# Altium integrated library CoLib.IntLib: 649 symbols (part 3 of 5) (continued)
## MPC8270CZUUPEA
designator U?
PQ2:450MHz主频100MHz总线; Manufacturer: Freescale; Name: 微处理器; 物料型号说明: 主频450MHz总线100MHz; Price: 350; 物料替代型号: n/a; Ordering NO.: MPC8270CZUUPEA
footprint TBGA480/1.27_29*29 (TBGA,480 Leads,Pitch=50mil (1.27mm),29行，29列)
part A pins: AB5 PA31/FCC1_MII_COL, AB26 PC0/DREQ1#/SMSYN2#/L1CLK0A2, AC4 PB31/FCC2_MII_TX_ER, AC5 PB30/FCC2_MII_RX_DV, AC25 PA1/REJECT1#/DONE3#, AC28 PD4/FCC3_RTS#/SMRXD2, AC29 PA0/RESTART1#/DREQ3, AD1 PC31/CLK1, AD2 PD31/RXD1, AD3 PA30/FCC1_MII_CRS, AD4 PD30/TXD1, AD5 PA28/FCC1_MII_TX_EN, AD25 PB6/FCC3_TXD1/L1RXDA2, AD26 PB5/FCC3_TXD2/L1TSYNCA2, AD27 PD5/DONE1#, AD28 PB4/FCC3_TXD3/L1RSYNCA2, AD29 PC1/DREQ2/L1RQA2#, AE1 PC30/CLK2, AE2 PB29/FCC2_MII_TX_EN, AE3 PB28/FCC2_MII_RX_ER, AE4 PD28/RXD2, AE8 PC25/CLK7, AE9 PB25/FCC2_TXD3, AE10 PC23/CLK9, AE12 PD23/RTS3#/TENA3#, AE13 PA21/FCC1_TXD3, AE14 PB18/FCC2_RXD3, AE15 PB23/FCC2_TXD1, AE16 PA17/FCC1_RXD0, AE18 PC12/CD2#/RENA2, AE19 PC11/CTS3#/CLSN3, AE20 PD14/L1CLKOC2/I2CSCL, AE21 PC9/CTS4#/CLSN4, AE22 PA10/MSNUM5, AE24 PA6, AE26 PB7/FCC3_TXD0/L1TXDA2, AE27 PC3/DACK2#/CTS4#, AE28 PA2/CLK20/DACK3#, AE29 PC2/DONE2#, AF1 PA29/FCC1_MII_TX_ER, AF2 PC29/CLK3/CTS1#/CLSN1, AF3 PC28/CLK4/CTS2#/CLSN2, AF7 PA27/FCC1_MII_RX_DV, AF9 PC24/CLK8, AF10 PD24/TXD3, AF12 PA22, AF13 PB19/FCC2_RXD2, AF15 PC16/CLK16, AF16 PD18/SPICLK, AF17 PA16/FCC1_RXD1, AF18 PA15/FCC1_RXD2, AF19 PB15/FCC3_MII_TX_ER, AF20 PC10/CD3#/RENA3, AF22 PC8/CD4#/RENA4, AF23 PA8/SMRXD2, AF24 PC5/SI2_L1ST3, AF27 PC4/SI2_L1ST4, AF28 PD7/SMSYN1/FCC1_CLAV2, AF29 PD6/DACK1#, AG1 PD29/RTS1#/TENA1, AG2 PC27/FCC3_TXD0/CLK5, AG7 PD27/TXD2, AG9 PD25/RXD3, AG10 PC22/CLK10, AG11 PA23, AG12 PB20/FCC2_RXD1, AG13 PC19/CLK13, AG15 PA19/FCC1_TXD1, AG16 PC15/CTS1#/CLSN1, AG17 PD17/SPIMOSI, AG18 PD16/SPIMISO, AG19 PA14/FCC1_RXD3, AG20 PB14/FCC3_MII_TX_EN, AG22 PB12/FCC3_MII_CRS, AG23 PD12, AG24 PB9/FCC3_RXD1/L1TXD2A2, AG25 PD8/SMRXD1, AG26 PA5/RESTART2#/DREQ4, AG28 PA4/REFECT2#/DONE4#, AG29 PA3/CLK19/DACK4#/L1RXD1A2, AH6 PB27/FCC2_MII_COL, AH7 PA26/FCC1_MII_RX_ER, AH8 PD26/RTS2#/TENA2, AH9 PA24/MSNUM1, AH11 PB21/FCC2_RXD0, AH12 PC20/CLK12, AH13 PD21/TXD4, AH14 PC18/CLK14, AH15 PD19/SPISEL, AH16 PB22/FCC2_TXD0, AH17 PC14/CD1#/RENA1, AH18 PC13/CTS2#/CLSN2, AH20 PA13/MSNUM2, AH21 PB13/FCC3_MII_COL, AH22 PA11/MSNUM4, AH23 PA9/SMTXD2, AH24 PB10/FCC3_RXD2, AH25 PA7/SMSYN2, AH26 PD9/SMTXD1, AH27 PB8/FCC3_RXD0, AJ6 PC26/CLK6, AJ7 PB26/FCC2_MII_CRS, AJ8 PA25/MSNUM0, AJ9 PB24/FCC2_TXD2, AJ11 PC21/CLK11, AJ12 PD22/RXD4, AJ13 PA20/FCC1_TXD2, AJ14 PD20/RTS4#/TENA4, AJ15 PC17/CLK15, AJ16 PA18/FCC1_TXD0, AJ17 PB17/FCC3_MII_RX_DV, AJ18 PB16/FCC3_MII_RX_ER, AJ20 PD15/L1RQC2#/I2CSDA, AJ21 PA12/MSNUM3, AJ22 PD13, AJ23 PD11/L1RQB2#, AJ24 PB11/FCC3_RXD3, AJ25 PC7/FCC1_CTS#, AJ26 PC6/FCC1_CD#, AJ27 PD10/L1CLKOB2/BRGO4
part B pins: AA1 THERMAL0, AA25 L-A27/GNT2#, AA26 L-A25/GNT0#, AA27 L-A23/REQ0#, AA28 L_D31/AD31 (io), AA29 L_D30/AD30 (io), AB27 L-A31/DLLOUT, AB28 L-A29/INTA#, AB29 L-A28/RST#, AE11 CLKIN2, AF25 PCI-MODE#, AG4 THERMAL1, B27 LSDAMUX/PCI-MODCK, C26 LGTA#/LUPMWAIT/LGPL4/LPBS#, C28 LSDWE#/PCI_MODCKH1, D25 LSDCAS#/PCI_MODCKH3, D27 LSDA10/PCI_MODCKH0, D28 LWR#, E26 LSDRAS#/PCI_MODCKH2, G29 LWE3#/LSDDQM3#/PCI_CFG3, H26 LWE2#/LSDDQM2#/PCI_CFG2, H27 LWE1#/LSDDQM1#/PCI_CFG1, H28 LWE0#/LSDDQM0#/PCI_CFG0, H29 L_D0/AD0 (io), J25 L_D5/AD5 (io), J26 L_D4/AD4 (io), J27 L_D3/AD3 (io), J28 L_D2/AD2 (io), J29 L_D1/AD1 (io), K25 L_D6/AD6 (io), L25 L_D10/AD10 (io), L26 L_D9/AD9 (io), L27 L_D8/AD8 (io), L28 L_DP0/BE0# (io), L29 L_D7/AD7 (io), M26 L_D14/AD14 (io), M27 L_D13/AD13 (io), M28 L_D12/AD12 (io), M29 L_D11/AD11 (io), N25 L-A26/GNT1#, N26 L-A22/SERR#, N27 L_A14/PAR, N28 L_DP1/BE1# (io), N29 L_D15/AD15 (io), P25 L-A30/REQ2#, P28 L-A21/PERR#, P29 L-A24/REQ1#, R26 L-A17/IRDY#/CKSTP-OUT#, R27 L-A16/TRDY#, R28 L-A19/DEVSEL#, R29 L-A18/STOP#, T25 L_D16/AD16 (io), T28 L_DP2/BE2# (io), T29 L-A15/FRAME#/SMI#, U5 SPARE4, U25 L_D19/AD19 (io), U26 L_D18/AD18 (io), U27 L_D17/AD17 (io), V4 SPARE6, V26 L_D23/AD23 (io), V27 L_D22/AD22 (io), V28 L_D21/AD21 (io), V29 L_D20/AD20 (io), W25 L_D26/AD26 (io), W26 L_D25/AD25 (io), W27 L_D24/AD24 (io), W28 L_DP3/BE3# (io), W29 L-A20/IDSEL, Y25 L_D29/AD29 (io), Y28 L_D28/AD28 (io), Y29 L_D27/AD27 (io)
part C pins: A1 VCC_3.3V (power), A2 VCC_3.3V (power), A9 VCC_1.5V (power), A19 VCC_1.5V (power), A28 VCC_3.3V (power), A29 VCC_3.3V (power), AA2 GND (power), AA4 VCC_3.3V (power), AA5 GND (power), AB1 GNDSYN, AB2 XFC, AB3 VCCSYN, AB25 GND (power), AC1 VCC_1.5V (power), AC2 VCC_1.5V (power), AC3 GND (power), AC26 GND (power), AC27 VCC_3.3V (power), AE5 VCC_3.3V (power), AE7 GND (power), AE17 GND (power), AE23 GND (power), AE25 VCC_3.3V (power), AF4 VCC_3.3V (power), AF8 GND (power), AF11 GND (power), AF14 GND (power), AF21 GND (power), AF26 VCC_3.3V (power), AG3 VCC_3.3V (power), AG8 VCC_3.3V (power), AG14 VCC_3.3V (power), AG21 VCC_3.3V (power), AG27 VCC_3.3V (power), AH1 VCC_3.3V (power), AH2 VCC_3.3V (power), AH10 VCC_1.5V (power), AH19 VCC_1.5V (power), AH28 VCC_3.3V (power), AH29 VCC_3.3V (power), AJ1 VCC_3.3V (power), AJ2 VCC_3.3V (power), AJ5 VCC_1.5V (power), AJ10 VCC_1.5V (power), AJ19 VCC_1.5V (power), AJ28 VCC_3.3V (power), AJ29 VCC_3.3V (power), B1 VCC_3.3V (power), B2 VCC_3.3V (power), B3 GND (power), B9 VCCSYN1, B19 VCC_1.5V (power), B28 VCC_3.3V (power), B29 VCC_3.3V (power), C3 VCC_3.3V (power), C7 VCC_3.3V (power), C9 GND (power), C14 VCC_3.3V (power), C16 VCC_3.3V (power), C20 VCC_3.3V (power), C23 VCC_3.3V (power), C27 VCC_3.3V (power), D4 VCC_3.3V (power), D7 GND (power), D10 GND (power), D14 GND (power), D16 GND (power), D20 GND (power), D23 GND (power), D26 VCC_3.3V (power), E5 VCC_3.3V (power), E10 VCC_3.3V (power), E11 GND (power), E13 GND (power), E15 GND (power), E19 GND (power), E22 GND (power), E25 VCC_3.3V (power), G5 GND (power), G26 GND (power), G27 VCC_3.3V (power), H3 VCC_3.3V (power), H4 GND (power), H25 GND (power), K5 GND (power), K26 VCC_3.3V (power), K27 GND (power), K28 VCC_1.5V (power), K29 VCC_1.5V (power), M1 VCC_1.5V (power), M2 VCC_1.5V (power), M3 GND (power), M4 VCC_3.3V (power), M25 GND (power), P5 GND (power), P26 GND (power), P27 VCC_3.3V (power), R25 GND (power), T3 VCC_3.3V (power), T4 GND (power), T26 GND (power), T27 VCC_3.3V (power), U28 VCC_1.5V (power), U29 VCC_1.5V (power), V25 GND (power), Y1 VCC_1.5V (power), Y2 VCC_1.5V (power), Y5 GND (power), Y26 GND (power), Y27 VCC_3.3V (power)
part D pins: A3 D39, A4 D30, A5 D22, A6 D6, A7 D53, A8 D21, A10 D44, A11 D12, A12 D35, A13 D3, A14 D42, A15 D34, A16 D2, A17 D41, A18 D1, A20 D8, A21 IRQ6#/DP6/CSE0, A22 IRQ1#/DP1/EXT_BG2#, A23 PGTA#/PUPMWAIT/PGPL4/PPBS#, A24 POE#/PSDRAS#/PGPL2, A25 PWE7#/PSDDQM7#/PBS7#, A26 PWE5#/PSDDQM5#/PBS5#, A27 BCTL0#, AA3 QREQ#, AB4 TRIS#, AE6 TDI, AF5 TDO, AF6 SRESET#, AG5 TCK, AG6 PORESET#, AH3 TRST#, AH4 CLKIN1, AH5 HRESET#, AJ3 TMS, AJ4 RSTCONF#, B4 D15, B5 D7, B6 D46, B7 D14, B8 D29, B10 D52, B11 D20, B12 D43, B13 D11, B14 D50, B15 D10, B16 D57, B17 D33, B18 D56, B20 D0, B21 IRQ5#/DP5/TBEN#/EXT_DBG3#, B22 DP0/RSRV#/EXT_BR2#, B23 PSDCAS#/PGPL3, B24 PSDWE#/PGPL1, B25 PWE6#/PSDDQM6#/PBS6#, B26 PWE4#/PSDDQM4#/PBS4#, C1 TSIZ0, C2 D63, C4 D47, C5 D23, C6 D54, C8 D37, C10 D60, C11 D28, C12 D51, C13 D19, C15 D26, C17 D25, C18 D48, C19 D24, C21 IRQ4#/DP4/CORE_SRESET#/EXT_BG3#, C22 TA#, C24 PWE3#/PSDDQM3#/PBS3#, C25 PWE0#/PSDDQM0#/PBS0#, C29 CS1#, D1 IRQ7#/INT_OUT#/APE#, D2 TSIZ2, D3 TBST#, D5 D55, D6 D62, D8 D45, D9 D5, D11 D36, D12 D59, D13 D27, D15 D18, D17, D18 D40, D19 D16, D21 IRQ3#/DP3/CKSTP_OUT#/EXT_BR3#, D22 PSDAMUX/PGPL5, D24 PWE2#/PSDDQM2#/PBS2#, D29 CS8#, E1 ARTRY#, E2 ABB#/IRQ2#, E3 TS#, E4 TSIZ1, E6 D31, E7 D38, E8 D61, E9 D13, E12 D4, E14 D58, E16 D49, E17 D9, E18 D32, E20 IRQ7#/DP7/CSE1, E21 IRQ2#/DP2/TLBISYNC#/EXT_DBG2#, E23 PSDA10/PGPL0, E24 PWE1#/PSDDQM1#/PBS1#, E27 CS2#, E28 CS3#, E29 CS9#, F1 TT0, F2 TT4, F3 AACK#, F4 BG#, F5 TSIZ3, F25 CS0#, F26 CS4#, F27 CS5#, F28 CS6#, F29 CS10#/BCTL1#, G1 A0, G2 TT3, G3 TT2, G4 TT1, G25 CS7#, G28 CS11#/AP0, H1 A3, H2 A2, H5 A1, J1 A8, J2 A7, J3 A6, J4 A5, J5 A4, K1 A12, K2 A11, K3 A10, K4 A9, L1 A17, L2 A16, L3 A15, L4 A14, L5 A13, M5 A18, N1 A23, N2 A22, N3 A21, N4 A20, N5 A19, P1 A27, P2 A26, P3 A25, P4 A24, R1 A28, R2 CPU_DBG#, R3 A29, R4 A31, R5 A30, T1 IRQ0#/NMI_OUT#, T2 ALE, T5 BADDR27, U1 BADDR28, U2 CI#/BADDR29/IRQ2#, U3 WT#/BADDR30/IRQ3#, U4 CPU_BG#/ADDR31/IRQ5#, V1 DBG#, V2 DBB#/IRQ3#, V3 PSDVAL#, V5 TEA#, W1 GBL#/IRQ1#, W2 MODCK1/AP1/TC0/BNKSEL0, W3 MODCK2/AP2/TC1/BNKSEL1, W4 MODCK3/AP3/TC2/BNKSEL2, W5 BR#, Y3 CPU_BR#, Y4 L2_HIT#/IRQ4#

## STC15F104W/SOP8
designator U?, comment STC15F104
单片机STC; Manufacturer: STC; 物料参考价格: 1.01; 物料说明: STC单片机,51兼容; Ordering NO.: STC15F104W/SO8; 物料型号说明: SO8封装; Name: 单片机; 物料替代型号: n/a
footprint SO8/1.27_4.9*3.9 (SOIC, 8-Leads, Body 4.9x3.9mm, Pitch 1.27mm,)
pins: 1 P3.4/RST/T0/~{INT2}/MCLKO, 2 VCC (power), 3 P3.5/T0CLKO/~{INT3}, 4 GND (power), 5 T2CLKO/~{INT4}/P3.0, 6 T2/P3.1, 7 INT0/P3.2, 8 RSTOUT_LOW/INT1/P3.3


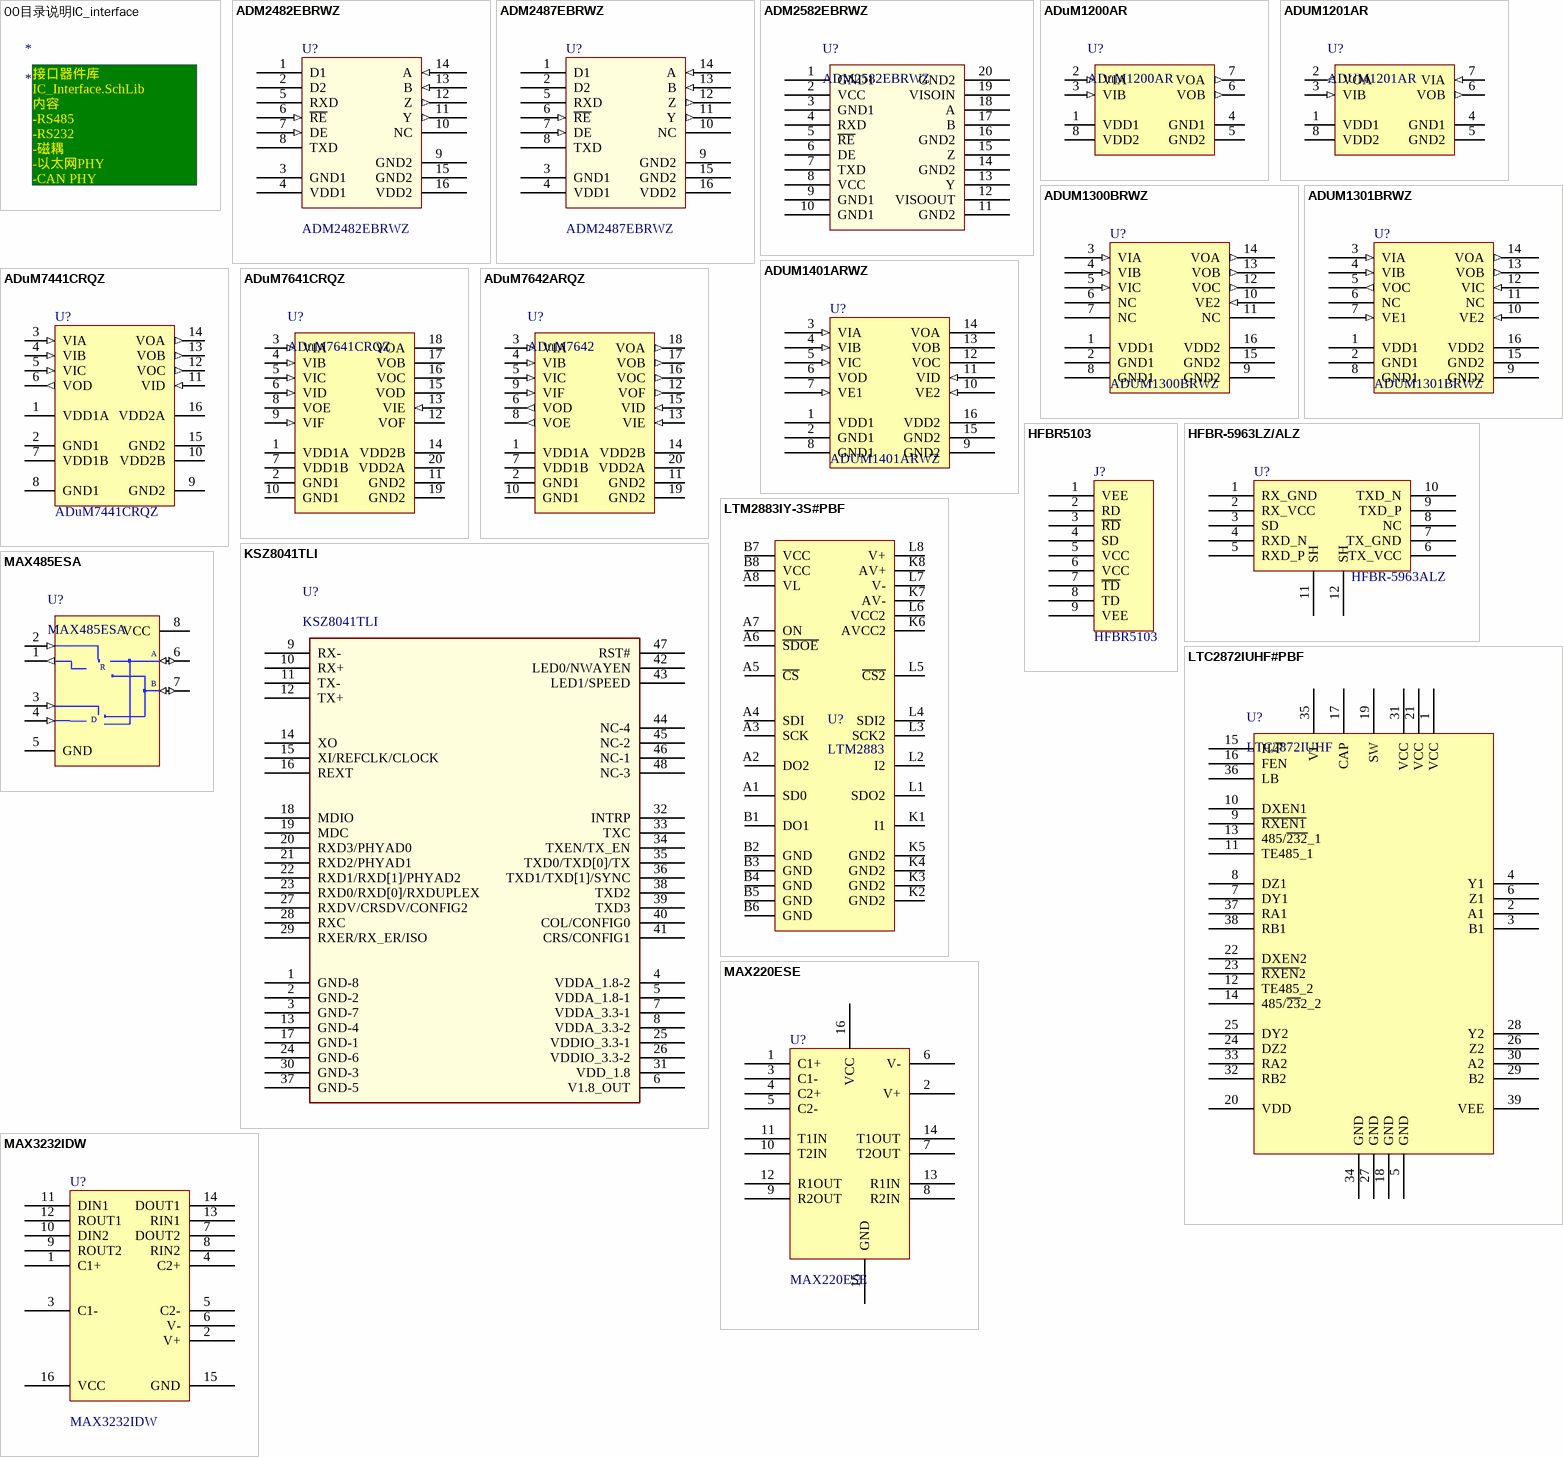
[diagram p24: symbols 00目录说明IC_interface to MAX3232IDW]

## 00目录说明IC_interface
designator *
text: 接口器件库 IC_Interface.SchLib / 内容 / -RS485 / -RS232 / -磁耦 / -以太网PHY / -CAN PHY /

## ADM2482EBRWZ
designator U?
RS485隔离收发器自带电源,速率16Mb; Manufacturer: ADI; Name: RS485收发器; Ordering NO.: ADM2482EBRWZ
footprint SO16/1.27_10.3*7.5 (16-Pin Wide Body Small Outline Integrated Circuit 1.27 mm Pitch, IPC Medium Density)
pins: 1 D1, 2 D2, 3 GND1 (power), 4 VDD1 (power), 5 RXD, 6 ~{RE} (in), 7 DE (in), 8 TXD, 9 GND2 (power), 10 NC, 11 Y (out), 12 Z (out), 13 B (in), 14 A (in), 15 GND2 (power), 16 VDD2 (power)

## ADM2487EBRWZ
designator U?
RS485隔离收发器自带电源,速率500kb; Manufacturer: ADI; Name: RS485收发器; Ordering NO.: ADM2487EBRWZ
footprint SO16/1.27_10.3*7.5 (16-Pin Wide Body Small Outline Integrated Circuit 1.27 mm Pitch, IPC Medium Density)
pins: 1 D1, 2 D2, 3 GND1 (power), 4 VDD1 (power), 5 RXD, 6 ~{RE} (in), 7 DE (in), 8 TXD, 9 GND2 (power), 10 NC, 11 Y (out), 12 Z (out), 13 B (in), 14 A (in), 15 GND2 (power), 16 VDD2 (power)

## ADM2582EBRWZ
designator U?
RS485隔离收发器自带电源,速率16M; Manufacturer: ADI; 物料型号说明: AD公司15KV隔离RS485收发器; Name: RS485收发器; Price: 25.01; 物料替代型号: n/a; Ordering NO.: ADM2582EBRWZ
footprint SO20/1.27_12.8*7.5 (SOIC, 20-Leads, Body 13.0x7.6mm (max), Pitch 1.27mm, IPC Medium Density)
pins: 1 GND1, 2 VCC, 3 GND1, 4 RXD, 5 ~{RE}, 6 DE, 7 TXD, 8 VCC, 9 GND1, 10 GND1, 11 GND2, 12 VISOOUT, 13 Y, 14 GND2, 15 Z, 16 GND2, 17 B, 18 A, 19 VISOIN, 20 GND2

## ADuM1200AR
designator U?
磁偶双发或收; Manufacturer: ADI; Name: 磁耦; Ordering NO.: ADuM1200AR
footprint SO8/1.27_4.9*3.9 (Footprint not found)
pins: 1 VDD1 (power) "Supply Voltage for Isolator Side 1.", 2 VIA (in) "Logic Input A.", 3 VIB (in) "Logic Input B.", 4 GND1 (power) "Ground 1. Ground Reference for Isolator Side 1.", 5 GND2 (power) "Ground 2. Ground Reference for Isolator Side 2.", 6 VOB (out) "Logic Output B.", 7 VOA (out) "Logic Output A.", 8 VDD2 (power) "Supply Voltage for Isolator Side 2."

## ADUM1201AR
designator U?
磁偶1发1收; Manufacturer: ADI; Name: 磁耦; Ordering NO.: ADUM1201AR
footprint SO8/1.27_4.9*3.9 (Footprint not found)
pins: 1 VDD1 (power) "Supply Voltage for Isolator Side 1.", 2 VOA (out) "Logic Output A.", 3 VIB (in) "Logic Input B.", 4 GND1 (power) "Ground 1. Ground Reference for Isolator Side 1.", 5 GND2 (power) "Ground 2. Ground Reference for Isolator Side 2.", 6 VOB (out) "Logic Output B.", 7 VIA (in) "Logic Input A.", 8 VDD2 (power) "Supply Voltage for Isolator Side 2."

## ADUM1300BRWZ
designator U?
Triple-Channel Digital Isolators; Manufacturer: ADI; Name: 磁耦; Ordering NO.: ADUM1300BRWZ
footprint SO16/1.27_10.3*7.5 (16-Pin Wide Body Small Outline Integrated Circuit 1.27 mm Pitch, IPC Medium Density)
pins: 1 VDD1 (power), 2 GND1 (power), 3 VIA (in), 4 VIB (in), 5 VIC (in), 6 NC, 7 NC, 8 GND1 (power), 9 GND2 (power), 10 VE2 (in), 11 NC, 12 VOC (out), 13 VOB (out), 14 VOA (out), 15 GND2 (power), 16 VDD2 (power)

## ADUM1301BRWZ
designator U?
两通道磁耦; Manufacturer: ADI; Name: 磁耦; Ordering NO.: ADUM1301BRWZ
footprint SO16/1.27_10.3*7.5 (16-Pin Wide Body Small Outline Integrated Circuit 1.27 mm Pitch, IPC Medium Density)
pins: 1 VDD1 (power), 2 GND1 (power), 3 VIA (in), 4 VIB (in), 5 VOC (out), 6 NC, 7 VE1 (in), 8 GND1 (power), 9 GND2 (power), 10 VE2 (in), 11 NC, 12 VIC (in), 13 VOB (out), 14 VOA (out), 15 GND2 (power), 16 VDD2 (power)

## ADUM1401ARWZ
designator U?
Quad-Channel Digital Isolators; Manufacturer: ADI; Name: 磁耦; Ordering NO.: ADUM1401ARWZ
footprint SO16/1.27_10.3*7.5 (16-Pin Wide Body Small Outline Integrated Circuit 1.27 mm Pitch, IPC Medium Density)
pins: 1 VDD1 (power), 2 GND1 (power), 3 VIA (in), 4 VIB (in), 5 VIC (in), 6 VOD (hiz), 7 VE1 (in), 8 GND1 (power), 9 GND2 (power), 10 VE2 (in), 11 VID (in), 12 VOC (hiz), 13 VOB (hiz), 14 VOA (oe), 15 GND2 (power), 16 VDD2 (power)

## ADuM7441CRQZ
designator U?
Quad-Channel Digital Isolators, 1kV RMS, 3 Input 1 Output, 25Mbps; Manufacturer: ADI; Name: 磁耦; Ordering NO.: ADuM7441CRQZ
footprint SSOP16/0.635_4.9*3.9 (SSOP; 16 Leads; Body Width 3.9 mm; Pitch 0.635 mm)
pins: 1 VDD1A (power), 2 GND1 (power), 3 VIA (in), 4 VIB (in), 5 VIC (in), 6 VOD (out), 7 VDD1B (power), 8 GND1 (power), 9 GND2 (power), 10 VDD2B (power), 11 VID (in), 12 VOC (out), 13 VOB (out), 14 VOA (out), 15 GND2 (power), 16 VDD2A (power)

## ADuM7641CRQZ
designator U?
1 kV RMS六通道数字隔离器; Manufacturer: ADI; NAME: 磁耦; Ordering NO.: ADuM7641CRQZ
footprint SOP20/0.635_8.66*3.9 (SOP, 20-Leads, Body 8.66x3.9mm, Pitch 0.635mm, IPC Medium Density)
pins: 1 VDD1A (power) "Supply Voltage A for Isolator Side 1 (3.0 V to 5.5 V). Pin 1 must be connected externally to Pin 7. Connect a 0.01 uF to 0.1 uF between VDD1A (Pin 1) and GND1 (Pin 2).", 2 GND1 (power) "Ground Reference for Isolator Side 1. Pin 2 and Pin 10 are internally connected, and connecting both pins to the PCB ground plane is recommended.", 3 VIA (in) "Logic Input A.", 4 VIB (in) "Logic Input B.", 5 VIC (in) "Logic Input C.", 6 VID (in) "Logic Input D.", 7 VDD1B (power) "Supply Voltage B for Isolator Side 1 (3.0 V to 5.5 V). Pin 7 must be connected externally to Pin 1. Connect a 0.01 uF to 0.1 uF between VDD1B (Pin 7) and GND1 (Pin 10).", 8 VOE (hiz) "Logic Output E.", 9 VIF (in) "Logic Input F.", 10 GND1 (power) "Ground Reference for Isolator Side 1. Pin 2 and Pin 10 are internally connected, and connecting both pins to the PCB ground plane is recommended.", 11 GND2 (power) "Ground Reference for Isolator Side 2. Pin 11 and Pin 19 are internally connected, and connecting both pins to the PCB ground plane is recommended.", 12 VOF (hiz) "Logic Output F.", 13 VIE (in) "Logic Input E.", 14 VDD2B (power) "Supply Voltage B for Isolator Side 2 (3.0 V to 5.5 V). Pin 14 must be connected externally to Pin 20. Connect a 0.01 uF to 0.1 uF between VDD2B (Pin 14) and GND2 (Pin 11).", 15 VOD (hiz) "Logic Output D.", 16 VOC (hiz) "Logic Output C.", 17 VOB (hiz) "Logic Output B.", 18 VOA (hiz) "Logic Output A.", 19 GND2 (power) "Ground Reference for Isolator Side 2. Pin 11 and Pin 19 are internally connected, and connecting both pins to the PCB ground plane is recommended.", 20 VDD2A (power) "Supply Voltage A for Isolator Side 2 (3.0 V to 5.5 V). Pin 20 must be connected externally to Pin 14. Connect a 0.01 uF to 0.1 uF between VDD2A (Pin 20) and GND2 (Pin 19)."

## ADuM7642ARQZ
designator U?, comment ADuM7642
1 kV RMS 六通道数字隔离器, 4输出, 2输入, 速率1Mbps; Manufacturer: ADI; Name: 磁耦; Ordering NO.: ADuM7642ARQZ
footprint SOP20/0.635_8.66*3.9 (SOP, 20-Leads, Body 8.66x3.9mm, Pitch 0.635mm, IPC Medium Density)
pins: 1 VDD1A (power) "Supply Voltage A for Isolator Side 1 (3.0 V to 5.5 V). Pin 1 must be connected externally to Pin 7. Connect a 0.01 uF to 0.1 uF between VDD1A (Pin 1) and GND1 (Pin 2).", 2 GND1 (power) "Ground Reference for Isolator Side 1. Pin 2 and Pin 10 are internally connected, and connecting both pins to the PCB ground plane is recommended.", 3 VIA (in) "Logic Input A.", 4 VIB (in) "Logic Input B.", 5 VIC (in) "Logic Input C.", 6 VOD (out) "Logic Input D.", 7 VDD1B (power) "Supply Voltage B for Isolator Side 1 (3.0 V to 5.5 V). Pin 7 must be connected externally to Pin 1. Connect a 0.01 uF to 0.1 uF between VDD1B (Pin 7) and GND1 (Pin 10).", 8 VOE (out) "Logic Output E.", 9 VIF (in) "Logic Input F.", 10 GND1 (power) "Ground Reference for Isolator Side 1. Pin 2 and Pin 10 are internally connected, and connecting both pins to the PCB ground plane is recommended.", 11 GND2 (power) "Ground Reference for Isolator Side 2. Pin 11 and Pin 19 are internally connected, and connecting both pins to the PCB ground plane is recommended.", 12 VOF (out) "Logic Output F.", 13 VIE (in) "Logic Input E.", 14 VDD2B (power) "Supply Voltage B for Isolator Side 2 (3.0 V to 5.5 V). Pin 14 must be connected externally to Pin 20. Connect a 0.01 uF to 0.1 uF between VDD2B (Pin 14) and GND2 (Pin 11).", 15 VID (in) "Logic Output D.", 16 VOC (out) "Logic Output C.", 17 VOB (out) "Logic Output B.", 18 VOA (out) "Logic Output A.", 19 GND2 (power) "Ground Reference for Isolator Side 2. Pin 11 and Pin 19 are internally connected, and connecting both pins to the PCB ground plane is recommended.", 20 VDD2A (power) "Supply Voltage A for Isolator Side 2 (3.0 V to 5.5 V). Pin 20 must be connected externally to Pin 14. Connect a 0.01 uF to 0.1 uF between VDD2A (Pin 20) and GND2 (Pin 19)."

## HFBR5103
designator J?
FDDI, 100 Mbps ATM, and  Fast Ethernet Transceivers  in Low Cost; Manufacturer: Hewlett Packard; Name: 百兆以太网收发器; Ordering NO.: HFBR5103
footprint SIP9/2.54 (9 Leads,Pitch=2.54mm,焊盘: 外径1.28mm,孔径0.8mm)
pins: 1 VEE, 2 RD, 3 ~{RD}, 4 SD, 5 VCC (power), 6 VCC (power), 7 ~{TD} (power), 8 TD, 9 VEE

## HFBR-5963LZ/ALZ
designator U?, comment HFBR-5963ALZ
Multimode Small Form Factor Transceiver with LC Connector, -40 °C to +85 °C, 1300 nm InGaAsP LED; Manufacturer: Avago; 物料型号说明: 工业温度; Ordering NO.: HFBR-5963LZ/ALZ; Name: 百兆光模块（LC接口）; 物料替代型号: HFBR-5963ALZ; Price: 100
footprint HFBR-5963LZ/ALZ (pitch=70mil)
pins: 1 RX_GND, 2 RX_VCC, 3 SD, 4 RXD_N, 5 RXD_P, 6 TX_VCC, 7 TX_GND, 8 NC, 9 TXD_P, 10 TXD_N, 11 SH, 12 SH

## KSZ8041TLI
designator U?
10Base-T/100Base-TX/100Base-FX  Physical Layer Transceiver; Manufacturer: MICREL; Name: PHY; Ordering NO.: KSZ8041TLI
footprint TQFP48/0.5_7*7 (TSQFP, 48-Leads, Body 9.0x9.0mm (max), Pitch 0.50mm, IPC Medium Density)
pins: 1 GND-8, 2 GND-2, 3 GND-7, 4 VDDA_1.8-2, 5 VDDA_1.8-1, 6 V1.8_OUT, 7 VDDA_3.3-1, 8 VDDA_3.3-2, 9 RX-, 10 RX+, 11 TX-, 12 TX+, 13 GND-4, 14 XO, 15 XI/REFCLK/CLOCK, 16 REXT, 17 GND-1, 18 MDIO, 19 MDC, 20 RXD3/PHYAD0, 21 RXD2/PHYAD1, 22 RXD1/RXD[1]/PHYAD2, 23 RXD0/RXD[0]/RXDUPLEX, 24 GND-6, 25 VDDIO_3.3-1, 26 VDDIO_3.3-2, 27 RXDV/CRSDV/CONFIG2, 28 RXC, 29 RXER/RX_ER/ISO, 30 GND-3, 31 VDD_1.8, 32 INTRP, 33 TXC, 34 TXEN/TX_EN, 35 TXD0/TXD[0]/TX, 36 TXD1/TXD[1]/SYNC, 37 GND-5, 38 TXD2, 39 TXD3, 40 COL/CONFIG0, 41 CRS/CONFIG1, 42 LED0/NWAYEN, 43 LED1/SPEED, 44 NC-4, 45 NC-2, 46 NC-1, 47 RST#, 48 NC-3

## LTC2872IUHF#PBF
designator U?, comment LTC2872IUHF
RS232/RS485 Dual  Multiprotocol Transceiver  with Integrated Termination; Manufacturer: Linear; Name: RS232/RS485双通道多协议收发器; Ordering NO.: LTC2872IUHF#PBF
footprint QFN38/0.5_5*7 (Footprint not found)
pins: 1 VCC, 2 A1, 3 B1, 4 Y1, 5 GND, 6 Z1, 7 DY1, 8 DZ1, 9 ~{RXEN1}, 10 DXEN1, 11 TE485_1, 12 TE485_2, 13 485/~{232}_1, 14 485/~{23}2_2, 15 H/~{F}, 16 FEN, 17 CAP, 18 GND, 19 SW, 20 VDD, 21 VCC, 22 DXEN2, 23 ~{RXEN}2, 24 DZ2, 25 DY2, 26 Z2, 27 GND, 28 Y2, 29 B2, 30 A2, 31 VCC, 32 RB2, 33 RA2, 34 GND, 35 VL, 36 LB, 37 RA1, 38 RB1, 39 VEE

## LTM2883IY-3S#PBF
designator U?, comment LTM2883
SPI/Digital or I2C μModule  Isolator with Adjustable ±12.5V  and 5V Regulated Power,Input 3V to 3.6V; Manufacturer: Linear; Ordering NO.: LTM2883IY-3S#PBF; Name: 磁耦隔离器
footprint BGA32/1.27_11*8 (BGA,32 Leads,15x11.25mm)
pins: A1 SD0, A2 DO2, A3 SCK, A4 SDI, A5 ~{CS}, A6 ~{SDOE}, A7 ON, A8 VL, B1 DO1, B2 GND, B3 GND, B4 GND, B5 GND, B6 GND, B7 VCC, B8 VCC, K1 I1, K2 GND2, K3 GND2, K4 GND2, K5 GND2, K6 AVCC2, K7 AV-, K8 AV+, L1 SDO2, L2 I2, L3 SCK2, L4 SDI2, L5 ~{CS2}, L6 VCC2, L7 V-, L8 V+

## MAX220ESE
designator U?
RS232收发器2发2收; Manufacturer: Maxim; Price: 3; Ordering NO.: MAX220ESE; Name: RS232收发器
footprint SOIC-16 (SOIC-16封装only)
pins: 1 C1+, 2 V+, 3 C1-, 4 C2+, 5 C2-, 6 V-, 7 T2OUT, 8 R2IN, 9 R2OUT, 10 T2IN, 11 T1IN, 12 R1OUT, 13 R1IN, 14 T1OUT, 15 GND (power), 16 VCC (power)

## MAX485ESA
designator U?
RS485 Transceiver 5V; Manufacturer: Maxim; Name: 485驱动芯片; 物料替代型号: MAX485; Price: 2; Ordering NO.: MAX485ESA
footprint SO8/1.27_4.9*3.9 (SOIC, 8-Leads, Body 4.9x3.9mm, Pitch 1.27mm,)
pins: 1 RO (out), 2 ~{RE} (in), 3 DE (in), 4 DI (in), 5 GND (power), 6 A (io), 7 B (io), 8 VCC (power)
text: R; D

## MAX3232IDW
designator U?
3V-5.5V MULTICHANNEL RS-232 LINE DRIVER/RECEIVER WITH 15KV ESD PROTECTION; Manufacturer: TI; Name: RS232收发器; Price: 3; Ordering NO.: MAX3232IDW
footprint SO16/1.27_10.3*7.5 (SOIC_W,16-Pin Wide Body Small Outline Integrated Circuit 1.27 mm Pitch, IPC Medium Density)
pins: 1 C1+, 2 V+, 3 C1-, 4 C2+, 5 C2-, 6 V-, 7 DOUT2, 8 RIN2, 9 ROUT2, 10 DIN2, 11 DIN1, 12 ROUT1, 13 RIN1, 14 DOUT1, 15 GND (power), 16 VCC (power)

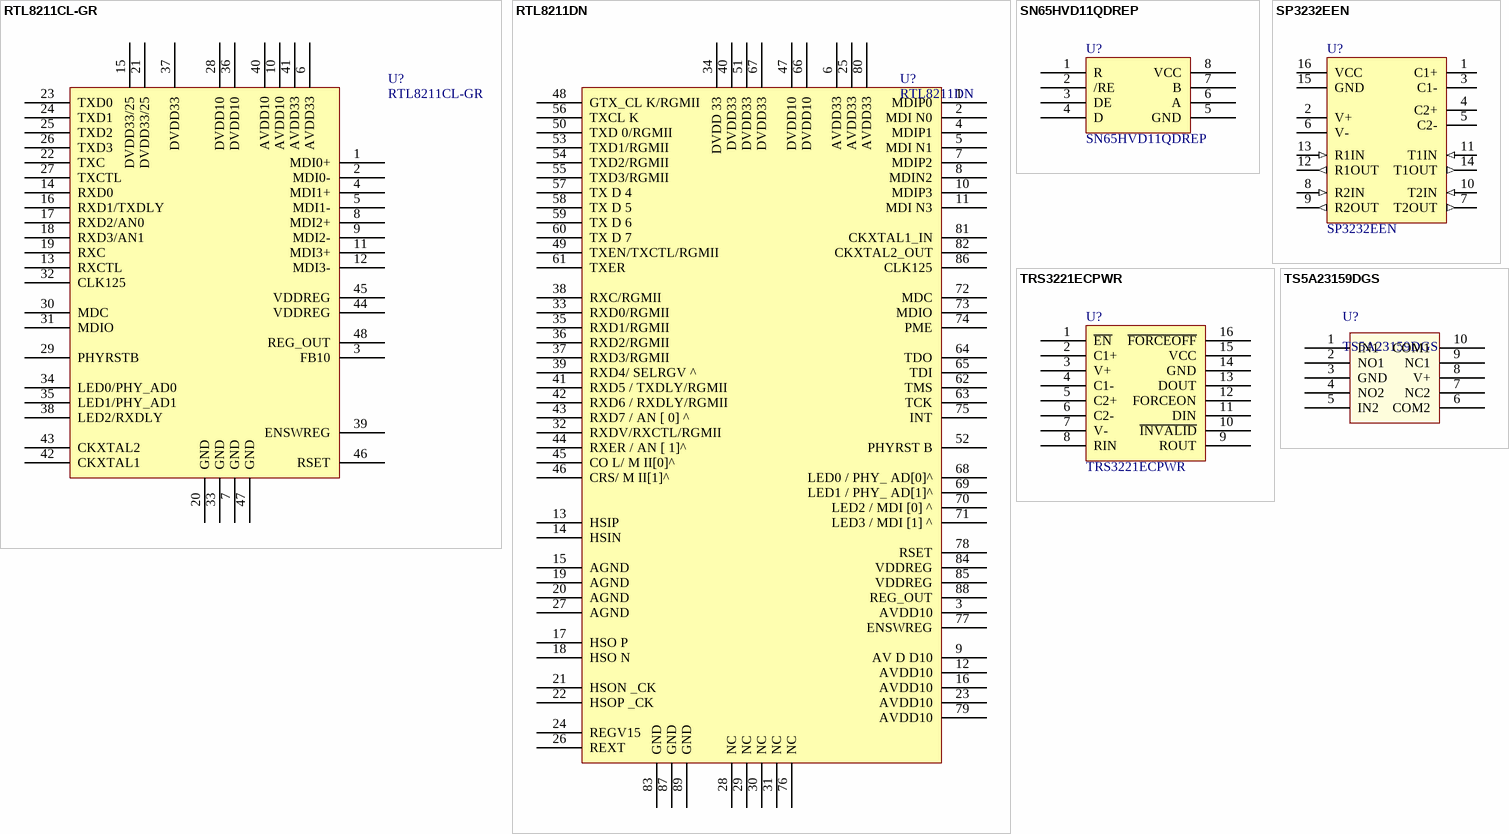
[diagram p25: symbols RTL8211CL-GR to TS5A23159DGS]

## RTL8211CL-GR
designator U?
1000TX的PHY; Manufacturer: RealTek; 物料型号说明: 千兆电口PHY LQFP48; Name: 千兆以太网PHY; tips: 千兆以太网PHY1000BASE-TX; Price_Date: 2011-07; Ordering NO.: RTL8211CL-GR; 物料替代型号: n/a; Price: 15
footprint LQFP48/0.5 (Footprint not found)
pins: 1 MDI0+, 2 MDI0-, 3 FB10, 4 MDI1+, 5 MDI1-, 6 AVDD33, 7 GND, 8 MDI2+, 9 MDI2-, 10 AVDD10, 11 MDI3+, 12 MDI3-, 13 RXCTL, 14 RXD0, 15 DVDD33/25, 16 RXD1/TXDLY, 17 RXD2/AN0, 18 RXD3/AN1, 19 RXC, 20 GND, 21 DVDD33/25, 22 TXC, 23 TXD0, 24 TXD1, 25 TXD2, 26 TXD3, 27 TXCTL, 28 DVDD10, 29 PHYRSTB, 30 MDC, 31 MDIO, 32 CLK125, 33 GND, 34 LED0/PHY_AD0, 35 LED1/PHY_AD1, 36 DVDD10, 37 DVDD33, 38 LED2/RXDLY, 39 ENSWREG, 40 AVDD10, 41 AVDD33, 42 CKXTAL1, 43 CKXTAL2, 44 VDDREG, 45 VDDREG, 46 RSET, 47 GND, 48 REG_OUT